# Altium footprint library NDLib.PCBLIB: 499 footprints (part 22 of 32)
Each footprint in its own frame and in the unit in brackets; x right, y up, seen from the top. Pads: shape width x height; smd on the part's side, far side on the other; paste and mask are expansions set on the pad; w line width, h text height; cw(c..) or ccw(c..) is an arc to the next point about the centre after c.
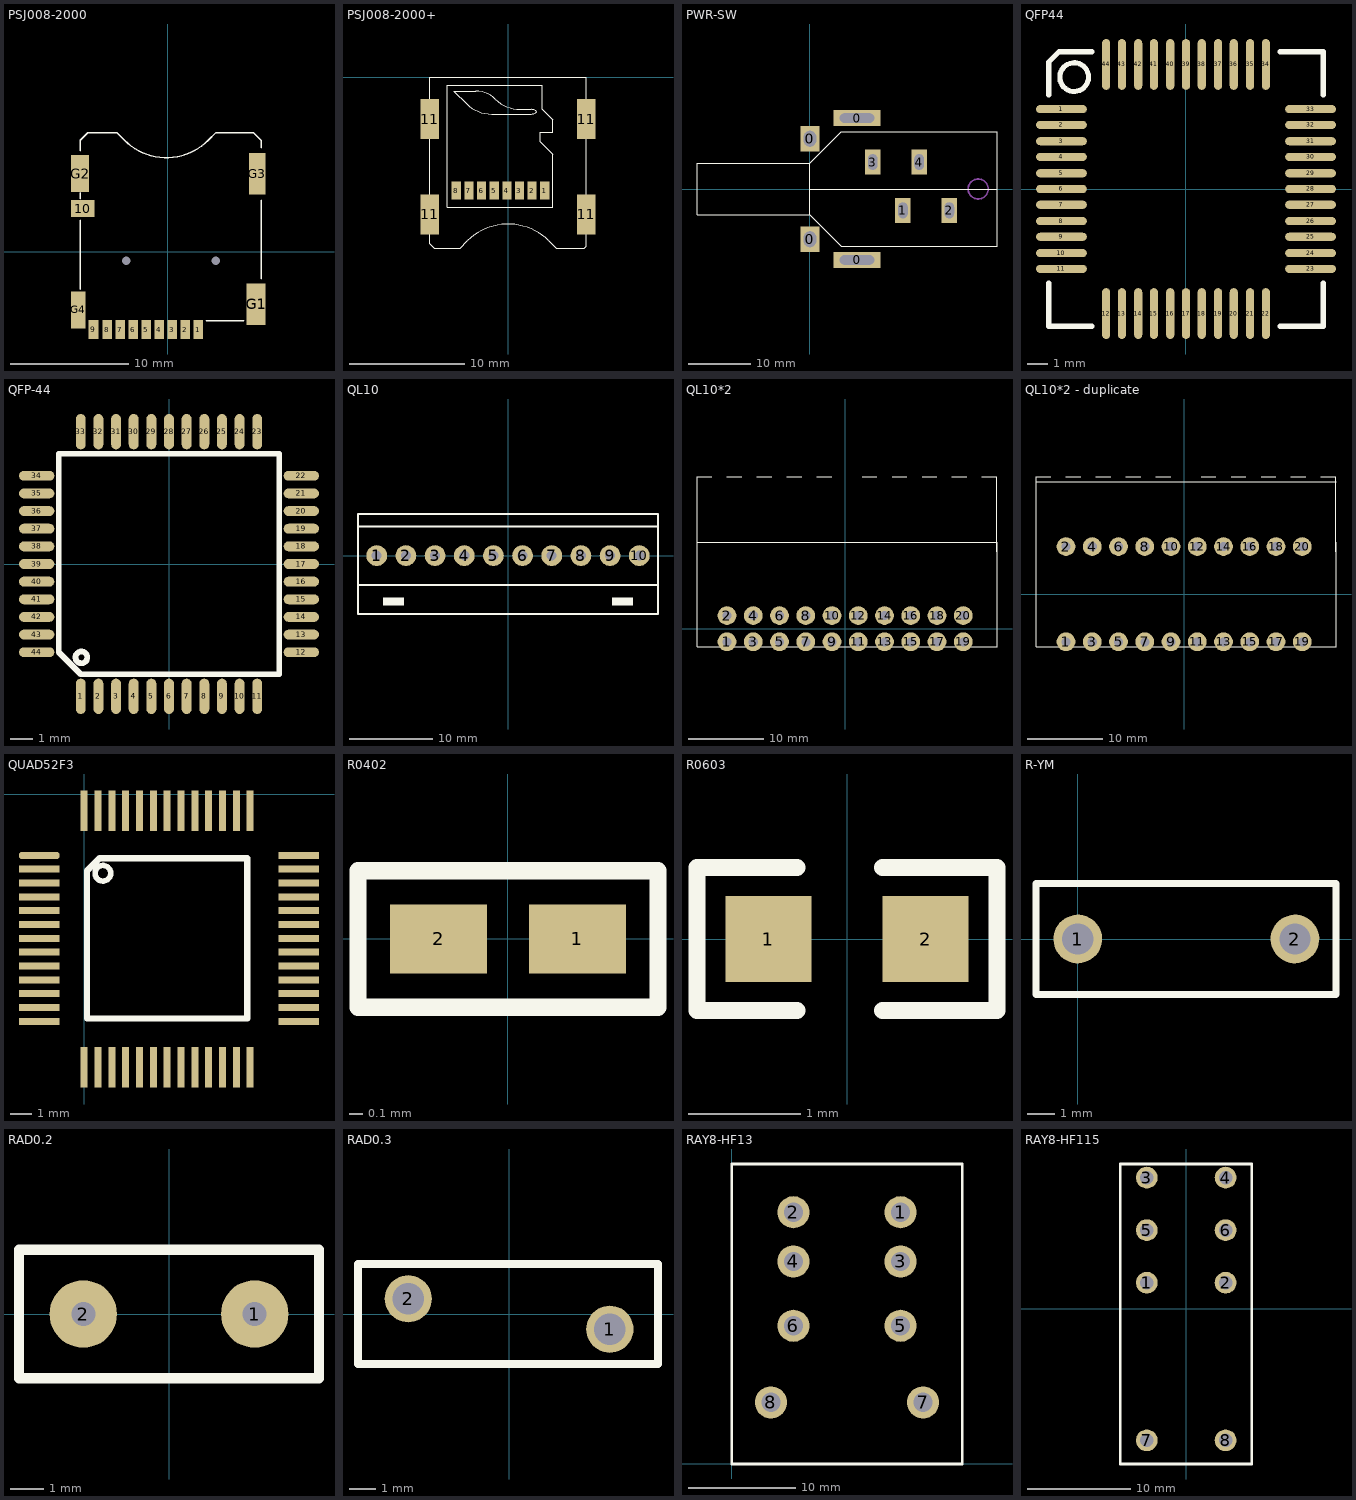
[diagram p21: the footprints below, top view; thin cyan lines are the x and y axes]

## PSJ008-2000 [mm]
pads (16):
  round 0.6 hole 0.7: 0(-3.5,-0.775) 0(4.05,-0.775)
  rect 0.8x1.6 smd: 1(2.575,-6.575) 2(1.475,-6.575) 3(0.375,-6.575) 4(-0.725,-6.575) 5(-1.825,-6.575) 6(-2.925,-6.575) 7(-4.025,-6.575) 8(-5.125,-6.575)
  rect 0.85x1.6 smd: 9(-6.275,-6.575)
  rect 1.95x1.4 smd: 10(-7.175,3.625)
  rect 1.6x3.5 smd: G1(7.45,-4.425)
  rect 1.5x3.1 smd: G2(-7.4,6.575)
  rect 1.4x3.5 smd: G3(7.55,6.575)
  rect 1.2x3.1 smd: G4(-7.55,-4.925)
TopOverlay:
  lines w0.127: -7.38,-3.188 -7.38,2.654 ; -7.38,4.432 -7.38,4.94 ; -7.38,8.496 -7.38,9.385 -6.745,10.02 -4.291,10.02 -3.656,9.385 ccw(c-0.121,12.921) 3.415,9.385 4.055,10.025 6.585,10.025 6.59,10.02 7.225,10.02 7.86,9.385 7.86,8.75 ; 3.25,-5.85 5.975,-5.85 6.4,-5.85 ; 7.86,-2.299 7.86,4.305

## PSJ008-2000+ [mm]
pads (12):
  rect 0.8x1.6 smd: 1(3.2,-9.85) 2(2.1,-9.85) 3(1,-9.85) 4(-0.1,-9.85) 5(-1.2,-9.85) 6(-2.3,-9.85) 7(-3.4,-9.85) 8(-4.5,-9.85)
  rect 1.6x3.5 smd: 11(-6.8,-11.93) 11(-6.8,-3.63) 11(6.8,-11.93) 11(6.8,-3.63)
TopOverlay:
  lines w0.1: -6.8,-14.2 -6.8,-14.5 ; -6.3,-14.869 -4.167,-14.869 -3.527,-14.229 cw(c0.009,-17.765) 3.544,-14.229 4.179,-14.864 6.633,-14.864 6.8,-14.697 6.8,-14.5 6.8,0 -6.8,0 -6.8,-14.5 ; -5.3,-14.869 -6.431,-14.869 -6.8,-14.5 ; -5.3,-2.3 -5.3,-0.7 3,-0.7 3,-2.8 3.9,-3.7 3.9,-4.8 2.8,-4.8 2.8,-5.6 3.9,-6.7 3.9,-11.3 -5.3,-11.3 -5.3,-1.7 ; -4.7,-1.2 -3.598,-2.302 ccw(c-1.43,-0.134) -1.43,-3.2 2.017,-3.2 ccw(c2.017,-2.517) 2.5,-3 ccw(c2.017,-3.483) 2.017,-2.8 1.07,-2.8 cw(c1.07,0.266) -1.098,-1.902 ccw(c-2.793,-3.597) -2.793,-1.2 -4.7,-1.2

## PWR-SW [mm]
height 5
pads (8):
  rect 3x4 hole 2 slot 2.5 at 90 deg: 0(0,-8) 0(0,8)
  rect 7.5x2.5 hole 1.5 slot 5.5 at 0 deg: 0(7.5,-11.3) 0(7.5,11.3)
  rect 2.5x4 hole 1.5 slot 2.5 at 90 deg: 1(14.8,-3.4) 2(22.2,-3.4) 3(10,4.3) 4(17.4,4.3)
TopOverlay:
  lines w0.152: 0,0 29.8,0 ; 0,-4.132 0,4.132 ; 0,-4.132 5.018,-9.15 29.8,-9.15 29.8,9.15 5.018,9.15 ; 0,-4.132 -18,-4.132 -18,4.132 0,4.132 ; 0,4.132 5.018,9.15 ; 0,4.132 5.018,9.15
Mechanical1:
  circle w0.254: c26.8,0 r1.6

## QFP44 [mil]
height 78.74
pads (44):
  oval 100x16 smd: 1(-245,157) 2(-245,126) 3(-245,94) 4(-245,63) 5(-245,31) 6(-245,0) 7(-245,-31) 8(-245,-63) 9(-245,-94) 10(-245,-126) 11(-245,-157) 23(245,-157) 24(245,-126) 25(245,-94) 26(245,-63) 27(245,-31) 28(245,0) 29(245,31) 30(245,63) 31(245,94) 32(245,126) 33(245,157)
  oval 16x100 smd: 12(-157,-245) 13(-126,-245) 14(-94,-245) 15(-63,-245) 16(-31,-245) 17(0,-245) 18(31,-245) 19(63,-245) 20(94,-245) 21(126,-245) 22(157,-245) 34(157,245) 35(126,245) 36(94,245) 37(63,245) 38(31,245) 39(0,245) 40(-31,245) 41(-63,245) 42(-94,245) 43(-126,245) 44(-157,245)
TopOverlay:
  circle w10: c-220,220 r28.28
  lines w10: -270,-185 -270,-270 -185,-270 ; -270,185 -270,250 -250,270 -185,270 ; 185,-270 270,-270 270,-185 ; 185,270 270,270 270,185

## QFP-44 [mm]
pads (44):
  oval 0.45x1.6 smd: 1(-4,-6) 2(-3.2,-6) 3(-2.4,-6) 4(-1.6,-6) 5(-0.8,-6) 6(0,-6) 7(0.8,-6) 8(1.6,-6) 9(2.4,-6) 10(3.2,-6) 11(4,-6) 23(4,6) 24(3.2,6) 25(2.4,6) 26(1.6,6) 27(0.8,6) 28(0,6) 29(-0.8,6) 30(-1.6,6) 31(-2.4,6) 32(-3.2,6) 33(-4,6)
  oval 1.6x0.45 smd: 12(6,-4) 13(6,-3.2) 14(6,-2.4) 15(6,-1.6) 16(6,-0.8) 17(6,0) 18(6,0.8) 19(6,1.6) 20(6,2.4) 21(6,3.2) 22(6,4) 34(-6,4) 35(-6,3.2) 36(-6,2.4) 37(-6,1.6) 38(-6,0.8) 39(-6,0) 40(-6,-0.8) 41(-6,-1.6) 42(-6,-2.4) 43(-6,-3.2) 44(-6,-4)
TopOverlay:
  circle w0.254: c-3.972,-4.232 r0.267
  lines w0.254: -5,-4 -5,5 5,5 5,-5 -4,-5 -5,-4
3D body: height 1.1, standoff -0.01, extent -6.006,-6 5.994,6

## QL10 [mm] "绿色双排  KF2EDGKRG-3.5/3.81"
height 15.2
pads (10):
  round 2.5 hole 1.2: 1(-15.75,0) 2(-12.25,0) 3(-8.75,0) 4(-5.25,0) 5(-1.75,0) 6(1.75,0) 7(5.25,0) 8(8.75,0) 9(12.25,0) 10(15.75,0)
TopOverlay:
  rectangle: -15,-6 -12.5,-5
  region: 15,-5 12.5,-5 12.5,-6 15,-6
  lines w0.25: -18,-3.5 18,-3.5 ; -18,-3.5 -18,3.5 ; -18,-3.5 -18,-7 18,-7 18,-3.5 ; -18,3.5 18,3.5 ; -18,3.5 -18,5 18,5 18,3.5 ; 18,-3.5 18,3.5

## QL10*2 [mm] "绿色双排  KF2EDGKRG-3.5/3.81"
height 15.2
pads (20):
  round 2.5 hole 1.2: 1(-15.75,-1.75) 2(-15.75,1.75) 3(-12.25,-1.75) 4(-12.25,1.75) 5(-8.75,-1.75) 6(-8.75,1.75) 7(-5.25,-1.75) 8(-5.25,1.75) 9(-1.75,-1.75) 10(-1.75,1.75) 11(1.75,-1.75) 12(1.75,1.75) 13(5.25,-1.75) 14(5.25,1.75) 15(8.75,-1.75) 16(8.75,1.75) 17(12.25,-1.75) 18(12.25,1.75) 19(15.75,-1.75) 20(15.75,1.75)
TopOverlay:
  lines w0.127: -19.75,11.55 -19.75,20.25 -17.75,20.25 ; -15.75,20.25 -13.75,20.25 ; -11.75,20.25 -9.75,20.25 ; -7.75,20.25 -5.75,20.25 ; -3.75,20.25 -1.75,20.25 ; 2.25,20.25 4.25,20.25 ; 6.25,20.25 8.25,20.25 ; 10.25,20.25 12.25,20.25 ; 14.25,20.25 16.25,20.25 ; 18.25,20.25 20.25,20.25 20.25,10.25
  lines w0.152: -19.75,-2.385 -19.75,11.55 20.25,11.55 20.25,-2.385 -19.75,-2.385

## QL10*2 - duplicate [mm] "绿色双排  KF2EDGKRG-3.5/3.81"
height 15.2
pads (20):
  round 2.5 hole 1.2: 1(-15.75,-6.35) 2(-15.75,6.35) 3(-12.25,-6.35) 4(-12.25,6.35) 5(-8.75,-6.35) 6(-8.75,6.35) 7(-5.25,-6.35) 8(-5.25,6.35) 9(-1.75,-6.35) 10(-1.75,6.35) 11(1.75,-6.35) 12(1.75,6.35) 13(5.25,-6.35) 14(5.25,6.35) 15(8.75,-6.35) 16(8.75,6.35) 17(12.25,-6.35) 18(12.25,6.35) 19(15.75,-6.35) 20(15.75,6.35)
TopOverlay:
  lines w0.127: -19.75,6.95 -19.75,15.65 -17.75,15.65 ; -15.75,15.65 -13.75,15.65 ; -11.75,15.65 -9.75,15.65 ; -7.75,15.65 -5.75,15.65 ; -3.75,15.65 -1.75,15.65 ; 2.25,15.65 4.25,15.65 ; 6.25,15.65 8.25,15.65 ; 10.25,15.65 12.25,15.65 ; 14.25,15.65 16.25,15.65 ; 18.25,15.65 20.25,15.65 20.25,5.65
  lines w0.152: -19.75,6.95 -19.75,-6.985 20.25,-6.985 20.25,6.95 ; -19.75,15.015 20.25,15.015

## QUAD52F3 [mil]
pads (52):
  oct 75x13 smd: 1(-82.99,-112.99)
  rect 75x13 smd: 2(-82.99,-138.58) 3(-82.99,-164.17) 4(-82.99,-189.76) 5(-82.99,-215.35) 6(-82.99,-240.94) 7(-82.99,-266.54) 8(-82.99,-292.13) 9(-82.99,-317.72) 10(-82.99,-343.31) 11(-82.99,-368.9) 12(-82.99,-394.49) 13(-82.99,-420.08) 27(397.01,-420.08) 28(397.01,-394.49) 29(397.01,-368.9) 30(397.01,-343.31) 31(397.01,-317.72) 32(397.01,-292.13) 33(397.01,-266.54) 34(397.01,-240.94) 35(397.01,-215.35) 36(397.01,-189.76) 37(397.01,-164.17) 38(397.01,-138.58) 39(397.01,-112.99)
  rect 13x75 smd: 14(0,-505.35) 15(25.59,-505.35) 16(51.19,-505.35) 17(76.78,-505.35) 18(102.37,-505.35) 19(127.96,-505.35) 20(153.55,-505.35) 21(179.14,-505.35) 22(204.73,-505.35) 23(230.32,-505.35) 24(255.91,-505.35) 25(281.5,-505.35) 26(307.09,-505.35) 40(307.09,-30) 41(281.5,-30) 42(255.91,-30) 43(230.32,-30) 44(204.72,-30) 45(179.13,-30) 46(153.54,-30) 47(127.95,-30) 48(102.36,-30) 49(76.77,-30) 50(51.18,-30) 51(25.59,-30) 52(0,-30)
TopOverlay:
  circle w10: c34.68,-146.06 r14.48
  lines w11.81: 5.32,-414.76 5.32,-186.61 5.32,-141.5 28.51,-118.31 73.62,-118.31 301.77,-118.31 301.77,-414.76 5.32,-414.76

## R0402 [mil]
pads (2):
  rect 28x20 smd: 1(20,0) 2(-20,0)
TopOverlay:
  lines w5: -43.31,-19.68 -43.31,19.68 43.31,19.68 43.31,-19.69 -43.31,-19.68

## R0603 [mil] "贴片0603"
pads (2):
  rect 30x30 smd: 1(-27.5,0) 2(27.5,0)
TopOverlay:
  lines w6: -17.5,-25 -52.5,-25 -52.5,25 -17.5,25 ; 12.5,-25 52.5,-25 52.5,25 12.5,25

## R-YM [mil]
pads (2):
  round 70 hole 45: 1(0,0) 2(312,0)
TopOverlay:
  lines w10: -60,-80 -60,80 371,80 371,-80 -60,-80

## RAD0.2 [mm]
height 10
pads (2):
  round 2 hole 0.711: 1(2.54,0) 2(-2.54,0)
TopOverlay:
  lines w0.305: -4.445,-1.905 4.445,-1.905 4.445,1.905 -4.445,1.905 -4.445,-1.905

## RAD0.3 [mm]
pads (2):
  round 1.8 hole 1.2: 1(3.84,-0.58) 2(-3.84,0.58)
TopOverlay:
  lines w0.305: -5.755,-1.905 -5.755,1.905 5.675,1.905 5.675,-1.905 -5.755,-1.905

## RAY8-HF13 [mm]
pads (8):
  round 3 hole 1.8: 1(15.75,23.5) 2(5.75,23.5) 3(15.75,18.9) 4(5.75,18.9) 5(15.75,12.9) 6(5.75,12.9) 7(17.85,5.75) 8(3.65,5.75)
TopOverlay:
  lines w0.254: 0,0 21.5,0 21.5,28 0,28 0,0

## RAY8-HF115 [mm]
pads (8):
  round 2.1 hole 1.3: 1(-3.81,2.54) 2(3.81,2.54) 3(-3.81,12.7) 4(3.81,12.7) 5(-3.81,7.62) 6(3.81,7.62) 7(-3.81,-12.7) 8(3.81,-12.7)
TopOverlay:
  lines w0.254: -6.367,-14.986 6.333,-14.986 6.333,14.014 -6.367,14.014 -6.367,-14.986